# Altium footprint library Vowstar_Basic_Device.PcbLib: 170 footprints (part 10 of 11)
Each footprint in its own frame and in the unit in brackets; x right, y up, seen from the top. Pads: shape width x height; smd on the part's side, far side on the other; paste and mask are expansions set on the pad; w line width, h text height; cw(c..) or ccw(c..) is an arc to the next point about the centre after c.
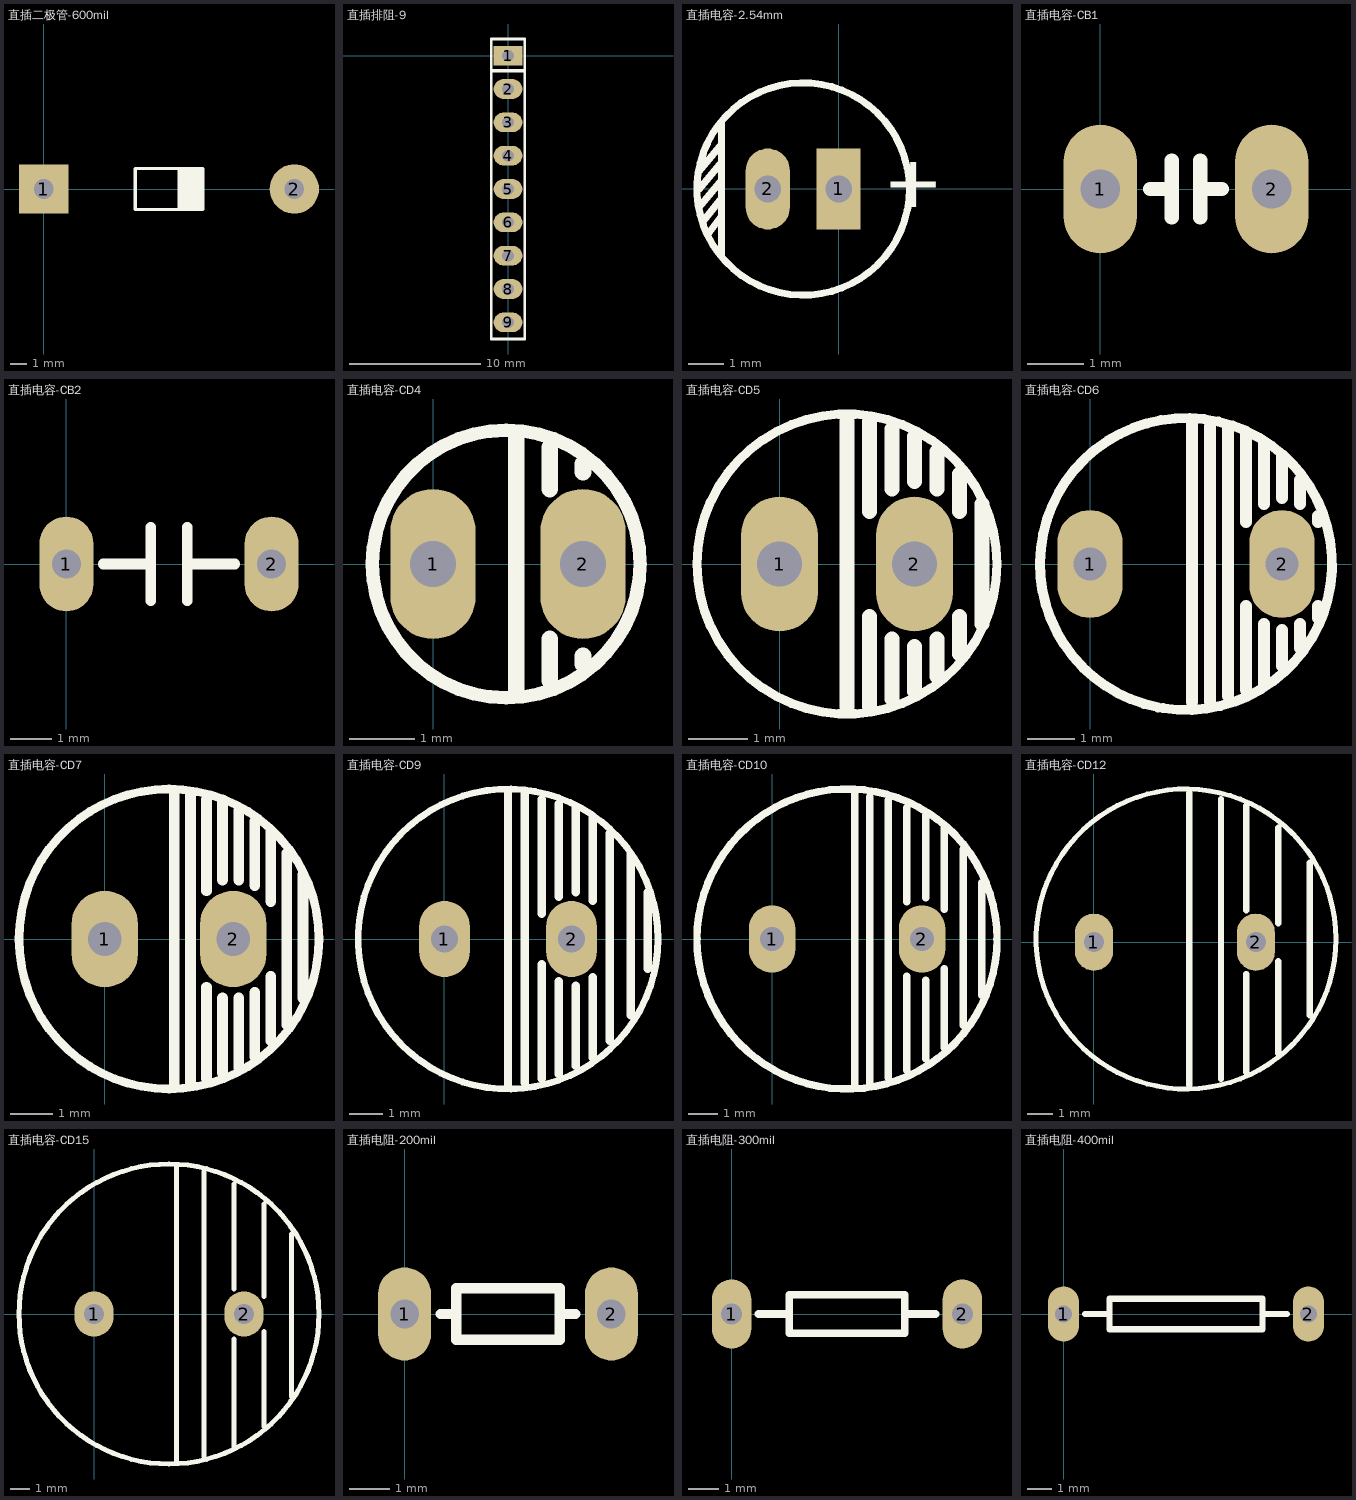
[diagram p9: the footprints below, top view; thin cyan lines are the x and y axes]

## 直插二极管-600mil [mm] "直插二极管-600mil"
pads (2):
  rect 3x3 hole 1.2: 1(0,0)
  round 3 hole 1.2 paste+0: 2(15.24,0)
Top Overlay:
  rectangle: 8.128,-1.25 9.77,1.25
  lines w0.2: 9.67,-1.25 5.57,-1.25 5.57,1.25 9.67,1.25

## 直插排阻-9 [mm] "直插排阻"
pads (9):
  rect 2.2x1.5 hole 0.9: 1(0,0)
  oval 2.2x1.5 hole 0.9: 2(0,-2.54) 3(0,-5.08) 4(0,-7.62) 5(0,-10.16) 6(0,-12.7) 7(0,-15.24) 8(0,-17.78) 9(0,-20.32)
Top Overlay:
  lines w0.2: -1.27,-21.59 1.27,-21.59 1.27,1.27 -1.27,1.27 -1.27,-21.59
  lines w0.254: -1.143,-1.143 1.143,-1.143

## 直插电容-2.54mm [mm] "直插电容-2.54mm"
height 10
pads (2):
  rect 1.25x2.286 hole 0.75: 1(0,0)
  oval 1.25x2.286 hole 0.75: 2(-2,0)
Top Overlay:
  circle w0.2: c-1,0 r3
  lines w0.2: -3.937,-0.508 -3.302,0.254 ; -3.937,0 -3.302,0.762 ; -3.937,0.508 -3.302,1.27 ; -3.81,-0.889 -3.302,-0.254 ; -3.683,-1.27 -3.302,-0.762 ; -3.302,-1.905 -3.302,1.905
  text "+" at 2.975,0.75 h1.5
3D body: height 10.01, standoff 10, extent -2.582,-1.778 0.804,1.615
3D body: height 10, standoff 1, extent -2.921,-2.032 1.063,1.96

## 直插电容-CB1 [mm] "直插电容"
pads (2):
  oval 1.3x2.286 hole 0.7: 1(0,0) 2(3.048,0)
Top Overlay:
  lines w0.254: 0.889,0 1.143,0 ; 1.27,-0.508 1.27,0.508 ; 1.778,-0.508 1.778,0.508 ; 1.778,0 2.159,0

## 直插电容-CB2 [mm] "直插电容"
pads (2):
  oval 1.3x2.286 hole 0.7: 1(0,0) 2(4.953,0)
Top Overlay:
  lines w0.254: 0.889,0 1.905,0 ; 2.032,-0.889 2.032,0.889 ; 2.921,-0.889 2.921,0.889 ; 3.048,0 4.064,0

## 直插电容-CD4 [mm] "直插电容"
pads (2):
  oval 1.3x2.286 hole 0.7: 1(0,0) 2(2.286,0)
Top Overlay:
  circle w0.203: c1.116,0 r2.04
  lines w0.254: 1.27,-1.905 1.27,1.905 ; 1.778,-1.778 1.778,-1.143 ; 1.778,1.143 1.778,1.778 ; 2.286,-1.524 2.286,-1.397 ; 2.286,1.397 2.286,1.524

## 直插电容-CD5 [mil] "直插电容"
pads (2):
  oval 51.18x90 hole 30: 1(0,0) 2(90,0)
Top Overlay:
  circle w6.06: c45,0 r100
  lines w10: 45,-95 45,95 ; 60,-95 60,-35 ; 60,35 60,95 ; 75,-90 75,-50 ; 75,50 75,90 ; 90,-85 90,-55 ; 90,55 90,85 ; 105,-75 105,-50 ; 105,50 105,75 ; 120,-60 120,-35 ; 120,35 120,60 ; 135,-40 135,40

## 直插电容-CD6 [mm] "直插电容"
pads (2):
  oval 1.38x2.286 hole 0.7: 1(0,0) 2(4.064,0)
Top Overlay:
  lines w0.21: 1.442,-3.033 cw(c2.032,0) 1.549,-3.052
  lines w0.254: 2.159,-2.921 2.159,3.048 ; 2.54,-2.921 2.54,2.921 ; 2.921,-2.794 2.921,2.921 ; 3.302,-2.667 3.302,-0.889 ; 3.302,0.889 3.302,2.794 ; 3.683,-2.54 3.683,-1.27 ; 3.683,1.27 3.683,2.54 ; 4.064,-2.159 4.064,-1.397 ; 4.064,1.397 4.064,2.286 ; 4.445,-1.778 4.445,-1.27 ; 4.445,1.27 4.445,1.778 ; 4.826,-1.143 4.826,-0.889 ; 4.826,0.889 4.826,1.016

## 直插电容-CD7 [mil] "直插电容"
pads (2):
  oval 62x90 hole 31.5: 1(0,0) 2(120,0)
Top Overlay:
  circle w8: c60,0 r140
  lines w10: 65,-135 65,135 ; 80,-135 80,135 ; 95,-130 95,-45 ; 95,45 95,130 ; 110,-125 110,-55 ; 110,55 110,130 ; 125,-120 125,-55 ; 125,55 125,120 ; 140,-110 140,-50 ; 140,50 140,110 ; 155,-95 155,-35 ; 155,35 155,100 ; 170,-80 170,80 ; 185,-55 185,60

## 直插电容-CD9 [mil] "直插电容"
pads (2):
  oval 60x90 hole 31.5: 1(0,0) 2(150,0)
Top Overlay:
  circle w7.87: c75,0 r177.16
  lines w10: 75,-175 75,175 ; 95,-170 95,175 ; 115,-165 115,-30 ; 115,30 115,165 ; 135,-160 135,-50 ; 135,50 135,160 ; 155,-150 155,-55 ; 155,55 155,155 ; 175,-140 175,-45 ; 175,45 175,145 ; 195,-120 195,125 ; 220,-90 220,100 ; 240,-35 240,55

## 直插电容-CD10 [mil] "直插电容"
pads (2):
  oval 62x90 hole 31.5: 1(0,0) 2(200,0)
Top Overlay:
  circle w10: c100,0 r200
  lines w10: 110,-195 110,200 ; 130,-195 130,190 ; 155,-185 155,185 ; 180,-175 180,-50 ; 180,50 180,175 ; 205,-160 205,-55 ; 205,55 205,165 ; 230,-145 230,-40 ; 230,40 230,150 ; 255,-115 255,120 ; 280,-75 280,75

## 直插电容-CD12 [mil] "直插电容"
pads (2):
  oval 60x90 hole 31.5: 1(0,0) 2(255,0)
Top Overlay:
  circle w7.87: c145,5 r236.22
  lines w10: 150,-225 150,235 ; 200,-215 200,225 ; 240,-205 240,-50 ; 240,50 240,215 ; 290,-175 290,-30 ; 290,30 290,180 ; 340,-115 340,125

## 直插电容-CD15 [mm] "直插电容"
pads (2):
  oval 2x2.286 hole 1: 1(0,0) 2(7.62,0)
Top Overlay:
  circle w0.254: c3.81,0 r7.62
  lines w0.254: 4.191,-7.493 4.191,7.493 ; 5.588,-7.239 5.588,7.239 ; 7.112,-6.731 7.112,-1.27 ; 7.112,1.27 7.112,6.604 ; 8.636,-5.715 8.636,-0.889 ; 8.636,0.889 8.636,5.588 ; 10.033,-4.191 10.033,4.064

## 直插电阻-200mil [mm] "直插电阻"
pads (2):
  oval 1.3x2.286 hole 0.7: 1(0,0) 2(5.08,0)
Top Overlay:
  lines w0.254: 0.889,0 1.27,0 ; 4.191,0 3.81,0 ; 1.27,0 1.27,-0.635 3.81,-0.635 3.81,0 ; 1.27,0 1.27,0.635 3.81,0.635 3.81,0

## 直插电阻-300mil [mm] "直插电阻"
pads (2):
  oval 1.3x2.286 hole 0.7: 1(0,0) 2(7.62,0)
Top Overlay:
  lines w0.254: 0.889,0 1.905,0 ; 5.715,0 6.731,0 ; 1.905,-0.635 1.905,0.635 5.715,0.635 5.715,0.381 5.715,-0.635 1.905,-0.635

## 直插电阻-400mil [mm] "直插电阻-400mil"
pads (2):
  oval 1.3x2.286 hole 0.7: 1(0,0) 2(10.16,0)
Top Overlay:
  lines w0.254: 0.889,0 1.905,0 ; 8.382,0 9.271,0 ; 1.905,-0.635 1.905,0.635 8.255,0.635 8.255,-0.635 1.905,-0.635